# Altium footprint library ICs And Semiconductors THD.PcbLib: 507 footprints (part 7 of 32)
Each footprint in its own frame and in the unit in brackets; x right, y up, seen from the top. Pads: shape width x height; smd on the part's side, far side on the other; paste and mask are expansions set on the pad; w line width, h text height; cw(c..) or ccw(c..) is an arc to the next point about the centre after c.
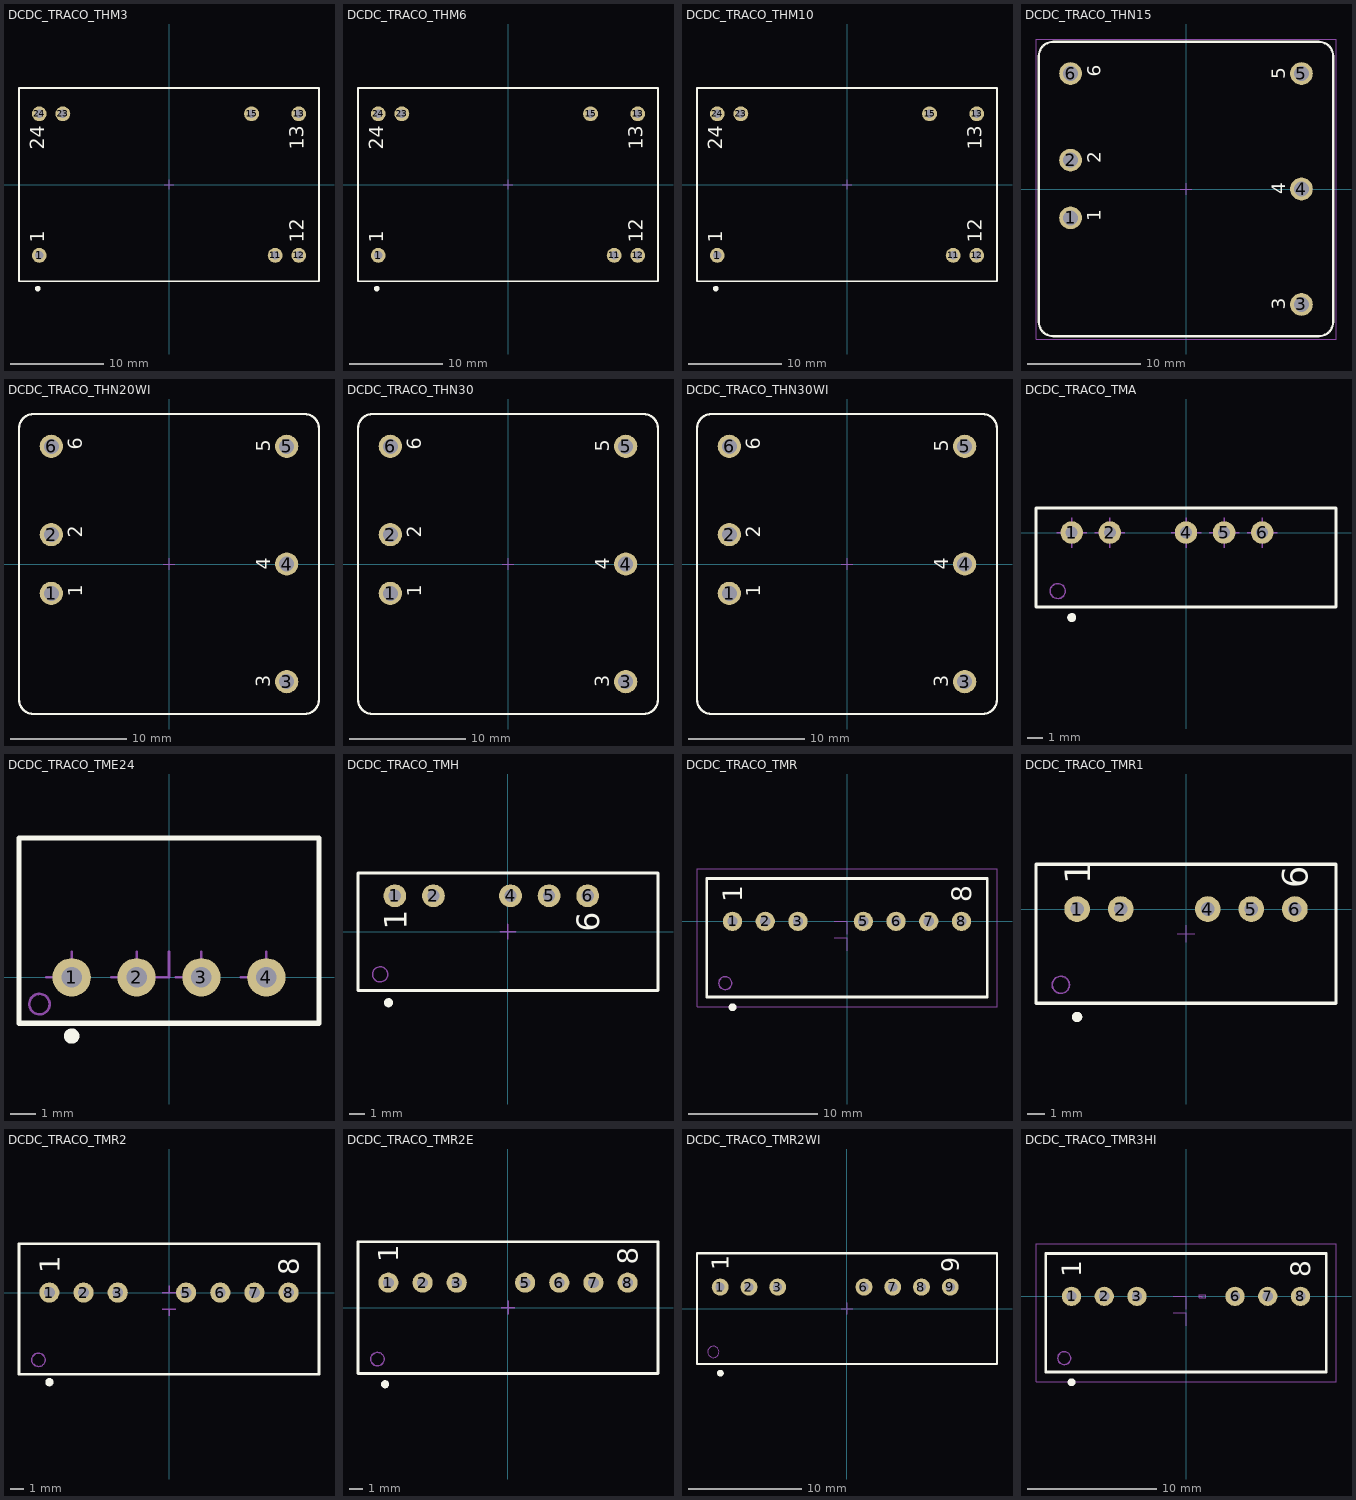
[diagram p6: the footprints below, top view; thin cyan lines are the x and y axes]

## DCDC_TRACO_THM3 [mm] "THM 3 Series , Body 31.8x20.3x10.2mm"
height 10.7
pads (7):
  round 1.6 hole 0.9: 1(-13.97,-7.62) 11(11.43,-7.62) 12(13.97,-7.62) 13(13.97,7.62) 15(8.89,7.62) 23(-11.43,7.62) 24(-13.97,7.62)
Top Overlay:
  circle w0.3: c-14.127,-11.2 r0.15
  lines w0.2: -16.15,-10.4 16.15,-10.4 16.15,10.4 -16.15,10.4 -16.15,-10.4
  text "1" at -13.447,-6.251 h1.5
  text "12" at 14.493,-6.251 h1.5
  text "13" at 14.523,3.769 h1.5
  text "24" at -13.417,3.769 h1.5
Notvisible:
  lines w0.1: -14.47,-7.62 -13.97,-7.62 ; -14.47,7.62 -13.97,7.62 ; -13.97,-8.12 -13.97,-7.62 ; -13.97,-7.12 -13.97,-7.62 ; -13.97,7.12 -13.97,7.62 ; -13.97,8.12 -13.97,7.62 ; -13.47,-7.62 -13.97,-7.62 ; -13.47,7.62 -13.97,7.62 ; -11.93,7.62 -11.43,7.62 ; -11.43,7.12 -11.43,7.62 ; -11.43,8.12 -11.43,7.62 ; -10.93,7.62 -11.43,7.62 ; -0.5,0 0,0 ; 0,-0.5 0,0 ; 0,0.5 0,0 ; 0.5,0 0,0 ; 8.39,7.62 8.89,7.62 ; 8.89,7.12 8.89,7.62 ; 8.89,8.12 8.89,7.62 ; 9.39,7.62 8.89,7.62 ; 10.93,-7.62 11.43,-7.62 ; 11.43,-8.12 11.43,-7.62 ; 11.43,-7.12 11.43,-7.62 ; 11.93,-7.62 11.43,-7.62 ; 13.47,-7.62 13.97,-7.62 ; 13.47,7.62 13.97,7.62 ; 13.97,-8.12 13.97,-7.62 ; 13.97,-7.12 13.97,-7.62 ; 13.97,7.12 13.97,7.62 ; 13.97,8.12 13.97,7.62 ; 14.47,-7.62 13.97,-7.62 ; 14.47,7.62 13.97,7.62
Mechanical 14:
  lines w0.1: -16.15,-10.4 16.15,-10.4 16.15,10.4 -16.15,10.4 -16.15,-10.4
  text "1" at -13.447,-6.251 h1.5
  text "12" at 14.493,-6.251 h1.5
  text "13" at 14.523,3.769 h1.5
  text "24" at -13.417,3.769 h1.5
3D body "DCDC_TRACO_THM3.stp": height 10.7, standoff -3.8, extent -16.15,-10.4 16.15,10.4

## DCDC_TRACO_THM6 [mm] "THM 6 Series , Body 31.8x20.3x10.2mm"
height 10.7
pads (7):
  round 1.6 hole 0.9: 1(-13.97,-7.62) 11(11.43,-7.62) 12(13.97,-7.62) 13(13.97,7.62) 15(8.89,7.62) 23(-11.43,7.62) 24(-13.97,7.62)
Top Overlay:
  circle w0.3: c-14.127,-11.2 r0.15
  lines w0.2: -16.15,-10.4 16.15,-10.4 16.15,10.4 -16.15,10.4 -16.15,-10.4
  text "1" at -13.447,-6.251 h1.5
  text "12" at 14.493,-6.251 h1.5
  text "13" at 14.523,3.769 h1.5
  text "24" at -13.417,3.769 h1.5
Notvisible:
  lines w0.1: -14.47,-7.62 -13.97,-7.62 ; -14.47,7.62 -13.97,7.62 ; -13.97,-8.12 -13.97,-7.62 ; -13.97,-7.12 -13.97,-7.62 ; -13.97,7.12 -13.97,7.62 ; -13.97,8.12 -13.97,7.62 ; -13.47,-7.62 -13.97,-7.62 ; -13.47,7.62 -13.97,7.62 ; -11.93,7.62 -11.43,7.62 ; -11.43,7.12 -11.43,7.62 ; -11.43,8.12 -11.43,7.62 ; -10.93,7.62 -11.43,7.62 ; -0.5,0 0,0 ; 0,-0.5 0,0 ; 0,0.5 0,0 ; 0.5,0 0,0 ; 8.39,7.62 8.89,7.62 ; 8.89,7.12 8.89,7.62 ; 8.89,8.12 8.89,7.62 ; 9.39,7.62 8.89,7.62 ; 10.93,-7.62 11.43,-7.62 ; 11.43,-8.12 11.43,-7.62 ; 11.43,-7.12 11.43,-7.62 ; 11.93,-7.62 11.43,-7.62 ; 13.47,-7.62 13.97,-7.62 ; 13.47,7.62 13.97,7.62 ; 13.97,-8.12 13.97,-7.62 ; 13.97,-7.12 13.97,-7.62 ; 13.97,7.12 13.97,7.62 ; 13.97,8.12 13.97,7.62 ; 14.47,-7.62 13.97,-7.62 ; 14.47,7.62 13.97,7.62
Mechanical 14:
  lines w0.1: -16.15,-10.4 16.15,-10.4 16.15,10.4 -16.15,10.4 -16.15,-10.4
  text "1" at -13.447,-6.251 h1.5
  text "12" at 14.493,-6.251 h1.5
  text "13" at 14.523,3.769 h1.5
  text "24" at -13.417,3.769 h1.5
3D body "DCDC_TRACO_THM6.stp": height 10.7, standoff -3.8, extent -16.15,-10.4 16.15,10.4

## DCDC_TRACO_THM10 [mm] "THM 10 Series , Body 31.8x20.3x10.2mm"
height 10.7
pads (7):
  round 1.6 hole 0.9: 1(-13.97,-7.62) 11(11.43,-7.62) 12(13.97,-7.62) 13(13.97,7.62) 15(8.89,7.62) 23(-11.43,7.62) 24(-13.97,7.62)
Top Overlay:
  circle w0.3: c-14.127,-11.2 r0.15
  lines w0.2: -16.15,-10.4 -16.15,10.4 16.15,10.4 16.15,-10.4 -16.15,-10.4
  text "24" at -13.417,3.769 h1.5
  text "13" at 14.523,3.769 h1.5
  text "12" at 14.493,-6.251 h1.5
  text "1" at -13.447,-6.251 h1.5
Notvisible:
  lines w0.1: -14.47,-7.62 -13.97,-7.62 ; -14.47,7.62 -13.97,7.62 ; -13.97,-8.12 -13.97,-7.62 ; -13.97,-7.12 -13.97,-7.62 ; -13.97,7.12 -13.97,7.62 ; -13.97,8.12 -13.97,7.62 ; -13.47,-7.62 -13.97,-7.62 ; -13.47,7.62 -13.97,7.62 ; -11.93,7.62 -11.43,7.62 ; -11.43,7.12 -11.43,7.62 ; -11.43,8.12 -11.43,7.62 ; -10.93,7.62 -11.43,7.62 ; -0.5,0 0,0 ; 0,-0.5 0,0 ; 0,0.5 0,0 ; 0.5,0 0,0 ; 8.39,7.62 8.89,7.62 ; 8.89,7.12 8.89,7.62 ; 8.89,8.12 8.89,7.62 ; 9.39,7.62 8.89,7.62 ; 10.93,-7.62 11.43,-7.62 ; 11.43,-8.12 11.43,-7.62 ; 11.43,-7.12 11.43,-7.62 ; 11.93,-7.62 11.43,-7.62 ; 13.47,-7.62 13.97,-7.62 ; 13.47,7.62 13.97,7.62 ; 13.97,-8.12 13.97,-7.62 ; 13.97,-7.12 13.97,-7.62 ; 13.97,7.12 13.97,7.62 ; 13.97,8.12 13.97,7.62 ; 14.47,-7.62 13.97,-7.62 ; 14.47,7.62 13.97,7.62
Mechanical 14:
  lines w0.1: -16.15,-10.4 -16.15,10.4 16.15,10.4 16.15,-10.4 -16.15,-10.4
  text "24" at -13.417,3.769 h1.5
  text "13" at 14.523,3.769 h1.5
  text "12" at 14.493,-6.251 h1.5
  text "1" at -13.447,-6.251 h1.5
3D body "DCDC_TRACO_THM10.stp": height 10.7, standoff -3.8, extent -16.15,-10.4 16.15,10.4

## DCDC_TRACO_THN15 [mm] "THN 15 Series , Body 25.4x25.4mm, Height 9.9mm"
height 9.9
pads (6):
  round 2 hole 1.3: 1(-10.16,-2.54) 2(-10.16,2.54) 3(10.16,-10.16) 4(10.16,0) 5(10.16,10.16) 6(-10.16,10.16)
Top Overlay:
  lines w0.2: -12.95,-11.7 ccw(c-11.7,-11.7) -11.7,-12.95 11.7,-12.95 ccw(c11.7,-11.7) 12.95,-11.7 12.95,11.7 ccw(c11.7,11.7) 11.7,12.95 -11.7,12.95 ccw(c-11.7,11.7) -12.95,11.7 -12.95,-11.7
  text "1" at -7.486,-2.819 h1.2
  text "2" at -7.486,2.261 h1.2
  text "6" at -7.486,9.881 h1.2
  text "5" at 8.756,9.677 h1.2
  text "4" at 8.756,-0.483 h1.2
  text "3" at 8.756,-10.643 h1.2
Notvisible:
  lines w0.1: -10.66,-2.54 -10.16,-2.54 ; -10.66,2.54 -10.16,2.54 ; -10.66,10.16 -10.16,10.16 ; -10.16,-3.04 -10.16,-2.54 ; -10.16,-2.04 -10.16,-2.54 ; -10.16,2.04 -10.16,2.54 ; -10.16,3.04 -10.16,2.54 ; -10.16,9.66 -10.16,10.16 ; -10.16,10.66 -10.16,10.16 ; -9.66,-2.54 -10.16,-2.54 ; -9.66,2.54 -10.16,2.54 ; -9.66,10.16 -10.16,10.16 ; -0.5,0 0,0 ; 0,-0.5 0,0 ; 0,0.5 0,0 ; 0.5,0 0,0 ; 9.66,-10.16 10.16,-10.16 ; 9.66,0 10.16,0 ; 9.66,10.16 10.16,10.16 ; 10.16,-10.66 10.16,-10.16 ; 10.16,-9.66 10.16,-10.16 ; 10.16,-0.5 10.16,0 ; 10.16,0.5 10.16,0 ; 10.16,9.66 10.16,10.16 ; 10.16,10.66 10.16,10.16 ; 10.66,-10.16 10.16,-10.16 ; 10.66,0 10.16,0 ; 10.66,10.16 10.16,10.16
Mechanical 14:
  lines w0.1: -12.95,-11.7 ccw(c-11.7,-11.7) -11.7,-12.95 11.7,-12.95 ccw(c11.7,-11.7) 12.95,-11.7 12.95,11.7 ccw(c11.7,11.7) 11.7,12.95 -11.7,12.95 ccw(c-11.7,11.7) -12.95,11.7 -12.95,-11.7
  text "1" at -7.486,-2.819 h1.2
  text "2" at -7.486,2.261 h1.2
  text "6" at -7.486,9.881 h1.2
  text "5" at 8.756,9.677 h1.2
  text "4" at 8.756,-0.483 h1.2
  text "3" at 8.756,-10.643 h1.2
Mechanical 15:
  lines w0.1: -13.2,-13.2 -13.2,13.2 13.2,13.2 13.2,-13.2 -13.2,-13.2
3D body "DCDC_TRACO_THN15.stp": height 9.9, standoff -3.6, extent -12.95,-12.95 12.95,12.95

## DCDC_TRACO_THN20WI [mm] "THN 20WI Series , Body 25.4x25.4mm, Height 9.9mm"
height 10.4
pads (6):
  round 2 hole 1.3: 1(-10.16,-2.54) 2(-10.16,2.54) 3(10.16,-10.16) 4(10.16,0) 5(10.16,10.16) 6(-10.16,10.16)
Top Overlay:
  lines w0.2: -12.95,-11.7 ccw(c-11.7,-11.7) -11.7,-12.95 11.7,-12.95 ccw(c11.7,-11.7) 12.95,-11.7 12.95,11.7 ccw(c11.7,11.7) 11.7,12.95 -11.7,12.95 ccw(c-11.7,11.7) -12.95,11.7 -12.95,-11.7
  text "3" at 8.756,-10.643 h1.2
  text "4" at 8.756,-0.483 h1.2
  text "5" at 8.756,9.677 h1.2
  text "6" at -7.486,9.881 h1.2
  text "2" at -7.486,2.261 h1.2
  text "1" at -7.486,-2.819 h1.2
Notvisible:
  lines w0.1: -10.66,-2.54 -10.16,-2.54 ; -10.66,2.54 -10.16,2.54 ; -10.66,10.16 -10.16,10.16 ; -10.16,-3.04 -10.16,-2.54 ; -10.16,-2.04 -10.16,-2.54 ; -10.16,2.04 -10.16,2.54 ; -10.16,3.04 -10.16,2.54 ; -10.16,9.66 -10.16,10.16 ; -10.16,10.66 -10.16,10.16 ; -9.66,-2.54 -10.16,-2.54 ; -9.66,2.54 -10.16,2.54 ; -9.66,10.16 -10.16,10.16 ; -0.5,0 0,0 ; 0,-0.5 0,0 ; 0,0.5 0,0 ; 0.5,0 0,0 ; 9.66,-10.16 10.16,-10.16 ; 9.66,0 10.16,0 ; 9.66,10.16 10.16,10.16 ; 10.16,-10.66 10.16,-10.16 ; 10.16,-9.66 10.16,-10.16 ; 10.16,-0.5 10.16,0 ; 10.16,0.5 10.16,0 ; 10.16,9.66 10.16,10.16 ; 10.16,10.66 10.16,10.16 ; 10.66,-10.16 10.16,-10.16 ; 10.66,0 10.16,0 ; 10.66,10.16 10.16,10.16
Mechanical 14:
  lines w0.1: -12.95,-11.7 ccw(c-11.7,-11.7) -11.7,-12.95 11.7,-12.95 ccw(c11.7,-11.7) 12.95,-11.7 12.95,11.7 ccw(c11.7,11.7) 11.7,12.95 -11.7,12.95 ccw(c-11.7,11.7) -12.95,11.7 -12.95,-11.7
  text "3" at 8.756,-10.643 h1.2
  text "4" at 8.756,-0.483 h1.2
  text "5" at 8.756,9.677 h1.2
  text "6" at -7.486,9.881 h1.2
  text "2" at -7.486,2.261 h1.2
  text "1" at -7.486,-2.819 h1.2
3D body "DCDC_TRACO_THN20WI.stp": height 9.9, standoff -3.6, extent -12.95,-12.95 12.95,12.95

## DCDC_TRACO_THN30 [mm] "THN 30 Series, Body 25.4x25.4mm, Height 9.9mm"
height 10.4
pads (6):
  round 2 hole 1.3: 1(-10.16,-2.54) 2(-10.16,2.54) 3(10.16,-10.16) 4(10.16,0) 5(10.16,10.16) 6(-10.16,10.16)
Top Overlay:
  lines w0.2: -12.95,-11.7 ccw(c-11.7,-11.7) -11.7,-12.95 11.7,-12.95 ccw(c11.7,-11.7) 12.95,-11.7 12.95,11.7 ccw(c11.7,11.7) 11.7,12.95 -11.7,12.95 ccw(c-11.7,11.7) -12.95,11.7 -12.95,-11.7
  text "3" at 8.756,-10.643 h1.2
  text "4" at 8.756,-0.483 h1.2
  text "5" at 8.756,9.677 h1.2
  text "6" at -7.486,9.881 h1.2
  text "2" at -7.486,2.261 h1.2
  text "1" at -7.486,-2.819 h1.2
Notvisible:
  lines w0.1: -10.66,-2.54 -10.16,-2.54 ; -10.66,2.54 -10.16,2.54 ; -10.66,10.16 -10.16,10.16 ; -10.16,-3.04 -10.16,-2.54 ; -10.16,-2.04 -10.16,-2.54 ; -10.16,2.04 -10.16,2.54 ; -10.16,3.04 -10.16,2.54 ; -10.16,9.66 -10.16,10.16 ; -10.16,10.66 -10.16,10.16 ; -9.66,-2.54 -10.16,-2.54 ; -9.66,2.54 -10.16,2.54 ; -9.66,10.16 -10.16,10.16 ; -0.5,0 0,0 ; 0,-0.5 0,0 ; 0,0.5 0,0 ; 0.5,0 0,0 ; 9.66,-10.16 10.16,-10.16 ; 9.66,0 10.16,0 ; 9.66,10.16 10.16,10.16 ; 10.16,-10.66 10.16,-10.16 ; 10.16,-9.66 10.16,-10.16 ; 10.16,-0.5 10.16,0 ; 10.16,0.5 10.16,0 ; 10.16,9.66 10.16,10.16 ; 10.16,10.66 10.16,10.16 ; 10.66,-10.16 10.16,-10.16 ; 10.66,0 10.16,0 ; 10.66,10.16 10.16,10.16
Mechanical 14:
  lines w0.1: -12.95,-11.7 ccw(c-11.7,-11.7) -11.7,-12.95 11.7,-12.95 ccw(c11.7,-11.7) 12.95,-11.7 12.95,11.7 ccw(c11.7,11.7) 11.7,12.95 -11.7,12.95 ccw(c-11.7,11.7) -12.95,11.7 -12.95,-11.7
  text "3" at 8.756,-10.643 h1.2
  text "4" at 8.756,-0.483 h1.2
  text "5" at 8.756,9.677 h1.2
  text "6" at -7.486,9.881 h1.2
  text "2" at -7.486,2.261 h1.2
  text "1" at -7.486,-2.819 h1.2
3D body "DCDC_TRACO_THN30.stp": height 9.9, standoff -3.6, extent -12.95,-12.95 12.95,12.95

## DCDC_TRACO_THN30WI [mm] "THN 30WI Series, Body 25.4x25.4mm, Height 9.9mm"
height 10.4
pads (6):
  round 2 hole 1.3: 1(-10.16,-2.54) 2(-10.16,2.54) 3(10.16,-10.16) 4(10.16,0) 5(10.16,10.16) 6(-10.16,10.16)
Top Overlay:
  lines w0.2: -12.95,-11.7 ccw(c-11.7,-11.7) -11.7,-12.95 11.7,-12.95 ccw(c11.7,-11.7) 12.95,-11.7 12.95,11.7 ccw(c11.7,11.7) 11.7,12.95 -11.7,12.95 ccw(c-11.7,11.7) -12.95,11.7 -12.95,-11.7
  text "1" at -7.486,-2.819 h1.2
  text "2" at -7.486,2.261 h1.2
  text "6" at -7.486,9.881 h1.2
  text "5" at 8.756,9.677 h1.2
  text "4" at 8.756,-0.483 h1.2
  text "3" at 8.756,-10.643 h1.2
Notvisible:
  lines w0.1: -10.66,-2.54 -10.16,-2.54 ; -10.66,2.54 -10.16,2.54 ; -10.66,10.16 -10.16,10.16 ; -10.16,-3.04 -10.16,-2.54 ; -10.16,-2.04 -10.16,-2.54 ; -10.16,2.04 -10.16,2.54 ; -10.16,3.04 -10.16,2.54 ; -10.16,9.66 -10.16,10.16 ; -10.16,10.66 -10.16,10.16 ; -9.66,-2.54 -10.16,-2.54 ; -9.66,2.54 -10.16,2.54 ; -9.66,10.16 -10.16,10.16 ; -0.5,0 0,0 ; 0,-0.5 0,0 ; 0,0.5 0,0 ; 0.5,0 0,0 ; 9.66,-10.16 10.16,-10.16 ; 9.66,0 10.16,0 ; 9.66,10.16 10.16,10.16 ; 10.16,-10.66 10.16,-10.16 ; 10.16,-9.66 10.16,-10.16 ; 10.16,-0.5 10.16,0 ; 10.16,0.5 10.16,0 ; 10.16,9.66 10.16,10.16 ; 10.16,10.66 10.16,10.16 ; 10.66,-10.16 10.16,-10.16 ; 10.66,0 10.16,0 ; 10.66,10.16 10.16,10.16
Mechanical 14:
  lines w0.1: -12.95,-11.7 ccw(c-11.7,-11.7) -11.7,-12.95 11.7,-12.95 ccw(c11.7,-11.7) 12.95,-11.7 12.95,11.7 ccw(c11.7,11.7) 11.7,12.95 -11.7,12.95 ccw(c-11.7,11.7) -12.95,11.7 -12.95,-11.7
  text "1" at -7.486,-2.819 h1.2
  text "2" at -7.486,2.261 h1.2
  text "6" at -7.486,9.881 h1.2
  text "5" at 8.756,9.677 h1.2
  text "4" at 8.756,-0.483 h1.2
  text "3" at 8.756,-10.643 h1.2
3D body "DCDC_TRACO_THN30WI.stp": height 9.9, standoff -3.6, extent -12.95,-12.95 12.95,12.95

## DCDC_TRACO_TMA [mm] "TMA Series , Body 19.5x6.1mm, SIP-6, Unregulated"
height 10.45
pads (5):
  round 1.5 hole 0.8: 1(-7.62,0) 2(-5.08,0) 4(0,0) 5(2.54,0) 6(5.08,0)
Top Overlay:
  circle w0.3: c-7.62,-5.667 r0.15
  lines w0.2: -10,-4.975 10,-4.975 10,1.625 -10,1.625 -10,-4.975
Notvisible:
  lines w0.1: -8.62,0 -7.62,0 ; -7.62,-1 -7.62,0 ; -7.62,1 -7.62,0 ; -6.62,0 -7.62,0 ; -6.08,0 -5.08,0 ; -5.08,-1 -5.08,0 ; -5.08,1 -5.08,0 ; -4.08,0 -5.08,0 ; -1,0 0,0 ; 0,-1 0,0 ; 0,1 0,0 ; 1,0 0,0 ; 1.54,0 2.54,0 ; 2.54,-1 2.54,0 ; 2.54,1 2.54,0 ; 3.54,0 2.54,0 ; 4.08,0 5.08,0 ; 5.08,-1 5.08,0 ; 5.08,1 5.08,0 ; 6.08,0 5.08,0
Mechanical 14:
  circle w0.1: c-8.55,-3.9 r0.5
  lines w0.1: -10,-4.975 10,-4.975 10,1.625 -10,1.625 -10,-4.975
  text "6" at 5.863,-2.157 h1.5
  text "1" at -6.87,-2.03 h1.5
3D body "DCDC_TRACO_TMA.stp": height 10.45, standoff -3.2, extent -10,-4.975 10,1.725

## DCDC_TRACO_TME24 [mm] "TME Series , Body 11.75x7.25mm, SIP-4 Package"
height 10.45
pads (4):
  round 1.5 hole 0.8: 1(-3.81,0) 2(-1.27,0) 3(1.27,0) 4(3.81,0)
Top Overlay:
  circle w0.3: c-3.81,-2.3 r0.15
  lines w0.2: -5.875,-1.8 -5.875,5.45 5.875,5.45 5.875,-1.8 -5.875,-1.8
Notvisible:
  lines w0.1: -4.81,0 -3.81,0 -3.81,1 ; -2.27,0 -1.27,0 -1.27,1 ; -1,0 0,0 0,1 ; 0.27,0 1.27,0 1.27,1 ; 2.81,0 3.81,0 3.81,1
Mechanical 14:
  circle w0.1: c-5.075,-1.05 r0.4
  lines w0.1: -5.875,-1.8 5.875,-1.8 5.875,5.45 -5.875,5.45 -5.875,-1.8 ; -4.06,-0.125 -3.56,-0.125 -3.56,0.125 -4.06,0.125 -4.06,-0.125 ; -1.52,-0.125 -1.02,-0.125 -1.02,0.125 -1.52,0.125 -1.52,-0.125 ; 1.02,-0.125 1.52,-0.125 1.52,0.125 1.02,0.125 1.02,-0.125 ; 3.56,-0.125 4.06,-0.125 4.06,0.125 3.56,0.125 3.56,-0.125
  text "1" at -3.435,-1.408 h0.75
  text "4" at 4.185,-1.533 h0.75
  text "-Vin" at -3.435,1.27 h0.75
  text "+Vin" at -0.895,1.27 h0.75
  text "-Vout" at 1.645,1.27 h0.75
  text "+Vout" at 4.185,1.27 h0.75
3D body "DCDC_TRACO_TME24.stp": height 10.45, standoff -3.2, extent -5.875,-1.8 5.875,5.45

## DCDC_TRACO_TMH [mm] "TMH Series , Body 19.5x7.5mm, Compact SIP Package"
height 10.45
pads (5):
  round 1.5 hole 0.8: 1(-7.45,2.375) 2(-4.91,2.375) 4(0.17,2.375) 5(2.71,2.375) 6(5.25,2.375)
Top Overlay:
  circle w0.3: c-7.865,-4.667 r0.15
  lines w0.2: -9.869,-3.875 9.881,-3.875 9.881,3.875 -9.869,3.875 -9.869,-3.875
  text "1" at -6.65,0.15 h1.5
  text "6" at 6.025,0 h1.5
Notvisible:
  lines w0.1: -7.95,2.375 -7.45,2.375 ; -7.45,1.875 -7.45,2.375 ; -7.45,2.875 -7.45,2.375 ; -6.95,2.375 -7.45,2.375 ; -5.41,2.375 -4.91,2.375 ; -4.91,1.875 -4.91,2.375 ; -4.91,2.875 -4.91,2.375 ; -4.41,2.375 -4.91,2.375 ; -0.5,0 0,0 ; -0.33,2.375 0.17,2.375 ; 0,-0.5 0,0 ; 0,0.5 0,0 ; 0.17,1.875 0.17,2.375 ; 0.17,2.875 0.17,2.375 ; 0.5,0 0,0 ; 0.67,2.375 0.17,2.375 ; 2.21,2.375 2.71,2.375 ; 2.71,1.875 2.71,2.375 ; 2.71,2.875 2.71,2.375 ; 3.21,2.375 2.71,2.375 ; 4.75,2.375 5.25,2.375 ; 5.25,1.875 5.25,2.375 ; 5.25,2.875 5.25,2.375 ; 5.75,2.375 5.25,2.375
  text "2" at -4.135,-0.1 h1.5
  text "4" at 0.945,-0.1 h1.5
  text "5" at 3.485,-0.1 h1.5
Mechanical 14:
  circle w0.1: c-8.419,-2.8 r0.5
  lines w0.1: -9.875,-3.875 9.875,-3.875 9.875,3.875 -9.875,3.875 -9.875,-3.875
  text "1" at -6.65,0.15 h1.5
  text "6" at 6.025,0 h1.5
3D body "DCDC_TRACO_TMH.stp": height 10.45, standoff -3.6, extent -9.875,-3.875 9.875,3.875

## DCDC_TRACO_TMR [mm] "TMR Series , Body 21.8x9.2mm, Compact SIP-8 Package"
height 11.1
pads (7):
  round 1.5 hole 0.8: 1(-8.89,0) 2(-6.35,0) 3(-3.81,0) 5(1.27,0) 6(3.81,0) 7(6.35,0) 8(8.89,0)
Top Overlay:
  circle w0.3: c-8.89,-6.667 r0.15
  lines w0.2: -10.9,-5.875 10.9,-5.875 10.9,3.325 -10.9,3.325 -10.9,-5.875
  text "8" at 9.64,1.5 h1.5
  text "1" at -8.14,1.5 h1.5
Notvisible:
  circle w0.05: c-8.89,0 r0.45
  lines w0.05: -9.14,0 -8.89,0 -8.89,-0.125 ; -6.6,0 -6.35,0 -6.35,-0.125 ; -4.06,0 -3.81,0 -3.81,-0.125 ; -1,-1.275 0,-1.275 0,-2.275 ; -1,0 0,0 0,-1 ; 1.02,0 1.27,0 1.27,-0.125 ; 3.56,0 3.81,0 3.81,-0.125 ; 6.1,0 6.35,0 6.35,-0.125 ; 8.64,0 8.89,0 8.89,-0.125 ; -9.14,-0.125 -9.14,0.125 -8.64,0.125 -8.64,-0.125 -9.14,-0.125 ; -6.6,-0.125 -6.1,-0.125 -6.1,0.125 -6.6,0.125 -6.6,-0.125 ; -4.06,-0.125 -3.56,-0.125 -3.56,0.125 -4.06,0.125 -4.06,-0.125 ; 1.02,-0.125 1.52,-0.125 1.52,0.125 1.02,0.125 1.02,-0.125 ; 3.56,-0.125 4.06,-0.125 4.06,0.125 3.56,0.125 3.56,-0.125 ; 6.1,-0.125 6.6,-0.125 6.6,0.125 6.1,0.125 6.1,-0.125 ; 8.64,-0.125 9.14,-0.125 9.14,0.125 8.64,0.125 8.64,-0.125
  text "2" at -5.6,1.5 h1.5
  text "3" at -3.06,1.5 h1.5
  text "5" at 2.02,1.5 h1.5
  text "6" at 4.56,1.5 h1.5
  text "7" at 7.1,1.5 h1.5
Mechanical 14:
  circle w0.1: c-9.45,-4.8 r0.5
  lines w0.1: -10.9,-5.875 10.9,-5.875 10.9,3.325 -10.9,3.325 -10.9,-5.875
  text "8" at 9.64,1.5 h1.5
  text "1" at -8.14,1.5 h1.5
Mechanical 15:
  lines w0.05: -11.65,-6.625 -11.65,4.075 11.65,4.075 11.65,-6.625 -11.65,-6.625
3D body "DCDC_TRACO_TMR.stp": height 11.1, standoff -3.6, extent -10.9,-5.875 10.9,3.325

## DCDC_TRACO_TMR1 [mm] "TMR 1 Series , Body 17.5x8.12mm, Compact SIP-6 Package"
height 11.5
pads (5):
  round 1.5 hole 0.8: 1(-6.35,0) 2(-3.81,0) 4(1.27,0) 5(3.81,0) 6(6.35,0)
Top Overlay:
  circle w0.3: c-6.35,-6.295 r0.15
  lines w0.2: -8.75,-5.495 -8.75,2.625 8.75,2.625 8.75,-5.495 -8.75,-5.495
  text "6" at 7.1,1.225 h1.5
  text "1" at -5.6,1.45 h1.5
Notvisible:
  lines w0.05: -6.85,0 -6.35,0 ; -6.35,-0.5 -6.35,0 ; -6.35,0.5 -6.35,0 ; -5.85,0 -6.35,0 ; -4.31,0 -3.81,0 ; -3.81,-0.5 -3.81,0 ; -3.81,0.5 -3.81,0 ; -3.31,0 -3.81,0 ; -0.5,-1.435 0,-1.435 ; 0,-1.935 0,-1.435 ; 0,-0.935 0,-1.435 ; 0.5,-1.435 0,-1.435 ; 0.77,0 1.27,0 ; 1.27,-0.5 1.27,0 ; 1.27,0.5 1.27,0 ; 1.77,0 1.27,0 ; 3.31,0 3.81,0 ; 3.81,-0.5 3.81,0 ; 3.81,0.5 3.81,0 ; 4.31,0 3.81,0 ; 5.85,0 6.35,0 ; 6.35,-0.5 6.35,0 ; 6.35,0.5 6.35,0 ; 6.85,0 6.35,0
Mechanical 14:
  circle w0.1: c-7.3,-4.42 r0.5
  lines w0.1: -8.75,-5.495 -8.75,2.625 8.75,2.625 8.75,-5.495 -8.75,-5.495
  text "6" at 7.1,1.225 h1.5
  text "1" at -5.6,1.45 h1.5
3D body "DCDC_TRACO_TMR1.stp": height 11.5, standoff -3.2, extent -8.75,-5.495 8.75,2.625

## DCDC_TRACO_TMR2 [mm] "TMR 2 Series , Body 21.8x9.2mm, Compact SIP-8 Package"
height 11.1
pads (7):
  round 1.5 hole 0.8: 1(-8.89,0) 2(-6.35,0) 3(-3.81,0) 5(1.27,0) 6(3.81,0) 7(6.35,0) 8(8.89,0)
Top Overlay:
  circle w0.3: c-8.89,-6.667 r0.15
  lines w0.2: -11.15,-6.075 -11.15,3.625 11.15,3.625 11.15,-6.075 -11.15,-6.075
  text "1" at -8.115,1.45 h1.5
  text "8" at 9.64,1.3 h1.5
Notvisible:
  lines w0.1: -9.39,0 -8.89,0 ; -8.89,-0.5 -8.89,0 ; -8.89,0.5 -8.89,0 ; -8.39,0 -8.89,0 ; -6.85,0 -6.35,0 ; -6.35,-0.5 -6.35,0 ; -6.35,0.5 -6.35,0 ; -5.85,0 -6.35,0 ; -4.31,0 -3.81,0 ; -3.81,-0.5 -3.81,0 ; -3.81,0.5 -3.81,0 ; -3.31,0 -3.81,0 ; -0.5,-1.225 0,-1.225 ; -0.5,0 0,0 ; 0,-1.725 0,-1.225 ; 0,0.5 0,0 ; 0.5,-1.225 0,-1.225 ; 0.5,0 0,0 ; 0.77,0 1.27,0 ; 1.27,-0.5 1.27,0 ; 1.27,0.5 1.27,0 ; 1.77,0 1.27,0 ; 3.31,0 3.81,0 ; 3.81,-0.5 3.81,0 ; 3.81,0.5 3.81,0 ; 4.31,0 3.81,0 ; 5.85,0 6.35,0 ; 6.35,-0.5 6.35,0 ; 6.35,0.5 6.35,0 ; 6.85,0 6.35,0 ; 8.39,0 8.89,0 ; 8.89,-0.5 8.89,0 ; 8.89,0.5 8.89,0 ; 9.39,0 8.89,0
  text "6" at 4.56,1.2 h1.5
  text "2" at -5.6,1.2 h1.5
  text "7" at 7.1,1.2 h1.5
  text "5" at 2.02,1.2 h1.5
  text "3" at -3.06,1.2 h1.5
Mechanical 14:
  circle w0.1: c-9.7,-5 r0.5
  lines w0.1: -11.15,-6.075 -11.15,3.625 11.15,3.625 11.15,-6.075 -11.15,-6.075
  text "1" at -8.115,1.45 h1.5
  text "8" at 9.64,1.3 h1.5
3D body "DCDC_TRACO_TMR2.stp": height 11.6, standoff -3.6, extent -11.15,-6.075 11.15,3.625

## DCDC_TRACO_TMR2E [mm] "TMR 2E Series , Body 21.8x9.3mm, SIP-7 Package"
height 11.7
pads (7):
  round 1.5 hole 0.8: 1(-8.89,1.86) 2(-6.35,1.86) 3(-3.81,1.86) 5(1.27,1.86) 6(3.81,1.86) 7(6.35,1.86) 8(8.89,1.86)
Top Overlay:
  circle w0.3: c-9.14,-5.693 r0.15
  lines w0.2: -11.15,-4.9 11.15,-4.9 11.15,4.9 -11.15,4.9 -11.15,-4.9
  text "1" at -8.14,3.36 h1.5
  text "8" at 9.64,3.185 h1.5
Notvisible:
  lines w0.1: -9.39,1.86 -8.89,1.86 ; -8.89,1.36 -8.89,1.86 ; -8.89,2.36 -8.89,1.86 ; -8.39,1.86 -8.89,1.86 ; -6.85,1.86 -6.35,1.86 ; -6.35,1.36 -6.35,1.86 ; -6.35,2.36 -6.35,1.86 ; -5.85,1.86 -6.35,1.86 ; -4.31,1.86 -3.81,1.86 ; -3.81,1.36 -3.81,1.86 ; -3.81,2.36 -3.81,1.86 ; -3.31,1.86 -3.81,1.86 ; -0.5,0 0,0 ; 0,-0.5 0,0 ; 0,0.5 0,0 ; 0.5,0 0,0 ; 0.77,1.86 1.27,1.86 ; 1.27,1.36 1.27,1.86 ; 1.27,2.36 1.27,1.86 ; 1.77,1.86 1.27,1.86 ; 3.31,1.86 3.81,1.86 ; 3.81,1.36 3.81,1.86 ; 3.81,2.36 3.81,1.86 ; 4.31,1.86 3.81,1.86 ; 5.85,1.86 6.35,1.86 ; 6.35,1.36 6.35,1.86 ; 6.35,2.36 6.35,1.86 ; 6.85,1.86 6.35,1.86 ; 8.39,1.86 8.89,1.86 ; 8.89,1.36 8.89,1.86 ; 8.89,2.36 8.89,1.86 ; 9.39,1.86 8.89,1.86
Mechanical 14:
  circle w0.1: c-9.7,-3.825 r0.5
  lines w0.1: -11.15,-4.9 11.15,-4.9 11.15,4.9 -11.15,4.9 -11.15,-4.9
  text "1" at -8.14,3.36 h1.5
  text "8" at 9.64,3.185 h1.5
3D body "DCDC_TRACO_TMR2E.stp": height 11.7, standoff -3.3, extent -11.15,-4.9 11.15,4.9

## DCDC_TRACO_TMR2WI [mm] "TMR 2WI Series , Body 26x9.3mm, SIP-9 Package"
height 13
pads (7):
  round 1.5 hole 0.8: 1(-11.2,1.9) 2(-8.66,1.9) 3(-6.12,1.9) 6(1.5,1.9) 7(4.04,1.9) 8(6.58,1.9) 9(9.12,1.9)
Top Overlay:
  circle w0.3: c-11.185,-5.7 r0.15
  lines w0.2: -13.25,-4.9 -13.25,4.9 13.25,4.9 13.25,-4.9 -13.25,-4.9
  text "9" at 9.87,3.225 h1.5
  text "1" at -10.45,3.4 h1.5
Notvisible:
  lines w0.1: -11.7,1.9 -11.2,1.9 ; -11.2,1.4 -11.2,1.9 ; -11.2,2.4 -11.2,1.9 ; -10.7,1.9 -11.2,1.9 ; -9.16,1.9 -8.66,1.9 ; -8.66,1.4 -8.66,1.9 ; -8.66,2.4 -8.66,1.9 ; -8.16,1.9 -8.66,1.9 ; -6.62,1.9 -6.12,1.9 ; -6.12,1.4 -6.12,1.9 ; -6.12,2.4 -6.12,1.9 ; -5.62,1.9 -6.12,1.9 ; -0.5,0 0,0 ; 0,-0.5 0,0 ; 0,0.5 0,0 ; 0.5,0 0,0 ; 1,1.9 1.5,1.9 ; 1.5,1.4 1.5,1.9 ; 1.5,2.4 1.5,1.9 ; 2,1.9 1.5,1.9 ; 3.54,1.9 4.04,1.9 ; 4.04,1.4 4.04,1.9 ; 4.04,2.4 4.04,1.9 ; 4.54,1.9 4.04,1.9 ; 6.08,1.9 6.58,1.9 ; 6.58,1.4 6.58,1.9 ; 6.58,2.4 6.58,1.9 ; 7.08,1.9 6.58,1.9 ; 8.62,1.9 9.12,1.9 ; 9.12,1.4 9.12,1.9 ; 9.12,2.4 9.12,1.9 ; 9.62,1.9 9.12,1.9
Mechanical 14:
  circle w0.1: c-11.8,-3.825 r0.5
  lines w0.1: -13.25,-4.9 -13.25,4.9 13.25,4.9 13.25,-4.9 -13.25,-4.9
  text "9" at 9.87,3.225 h1.5
  text "1" at -10.45,3.4 h1.5
3D body "DCDC_TRACO_TMR2WI.stp": height 13, standoff -3.2, extent -13.25,-4.9 13.25,4.9

## DCDC_TRACO_TMR3HI [mm] "TMR 3 Series, Body 21.8x9.2mm, Compact SIP-8 Package, HI Version"
height 11.1
pads (6):
  round 1.5 hole 0.8: 1(-8.89,0) 2(-6.35,0) 3(-3.81,0) 6(3.81,0) 7(6.35,0) 8(8.89,0)
Top Overlay:
  circle w0.3: c-8.89,-6.667 r0.15
  lines w0.2: -10.9,-5.875 10.9,-5.875 10.9,3.325 -10.9,3.325 -10.9,-5.875
  text "8" at 9.64,1.5 h1.5
  text "1" at -8.14,1.5 h1.5
Notvisible:
  circle w0.05: c-8.89,0 r0.45
  lines w0.05: -9.14,0 -8.89,0 -8.89,-0.125 ; -6.6,0 -6.35,0 -6.35,-0.125 ; -4.06,0 -3.81,0 -3.81,-0.125 ; -1,-1.275 0,-1.275 0,-2.275 ; -1,0 0,0 0,-1 ; 1.02,0 1.27,0 1.27,-0.125 ; 3.56,0 3.81,0 3.81,-0.125 ; 6.1,0 6.35,0 6.35,-0.125 ; 8.64,0 8.89,0 8.89,-0.125 ; -9.14,-0.125 -9.14,0.125 -8.64,0.125 -8.64,-0.125 -9.14,-0.125 ; -6.6,-0.125 -6.1,-0.125 -6.1,0.125 -6.6,0.125 -6.6,-0.125 ; -4.06,-0.125 -3.56,-0.125 -3.56,0.125 -4.06,0.125 -4.06,-0.125 ; 1.02,-0.125 1.52,-0.125 1.52,0.125 1.02,0.125 1.02,-0.125 ; 3.56,-0.125 4.06,-0.125 4.06,0.125 3.56,0.125 3.56,-0.125 ; 6.1,-0.125 6.6,-0.125 6.6,0.125 6.1,0.125 6.1,-0.125 ; 8.64,-0.125 9.14,-0.125 9.14,0.125 8.64,0.125 8.64,-0.125
  text "2" at -5.6,1.5 h1.5
  text "3" at -3.06,1.5 h1.5
  text "5" at 2.02,1.5 h1.5
  text "6" at 4.56,1.5 h1.5
  text "7" at 7.1,1.5 h1.5
Mechanical 14:
  circle w0.1: c-9.45,-4.8 r0.5
  lines w0.1: -10.9,-5.875 10.9,-5.875 10.9,3.325 -10.9,3.325 -10.9,-5.875
  text "8" at 9.64,1.5 h1.5
  text "1" at -8.14,1.5 h1.5
Mechanical 15:
  lines w0.05: -11.65,-6.625 -11.65,4.075 11.65,4.075 11.65,-6.625 -11.65,-6.625
3D body "DCDC_TRACO_TMR3HI.stp": height 11.1, standoff -3.6, extent -10.9,-5.875 10.9,3.325